# Altium footprint library ADP_Connector.PcbLib: 49 footprints (part 1 of 4)
Each footprint in its own frame and in the unit in brackets; x right, y up, seen from the top. Pads: shape width x height; smd on the part's side, far side on the other; paste and mask are expansions set on the pad; w line width, h text height; cw(c..) or ccw(c..) is an arc to the next point about the centre after c.
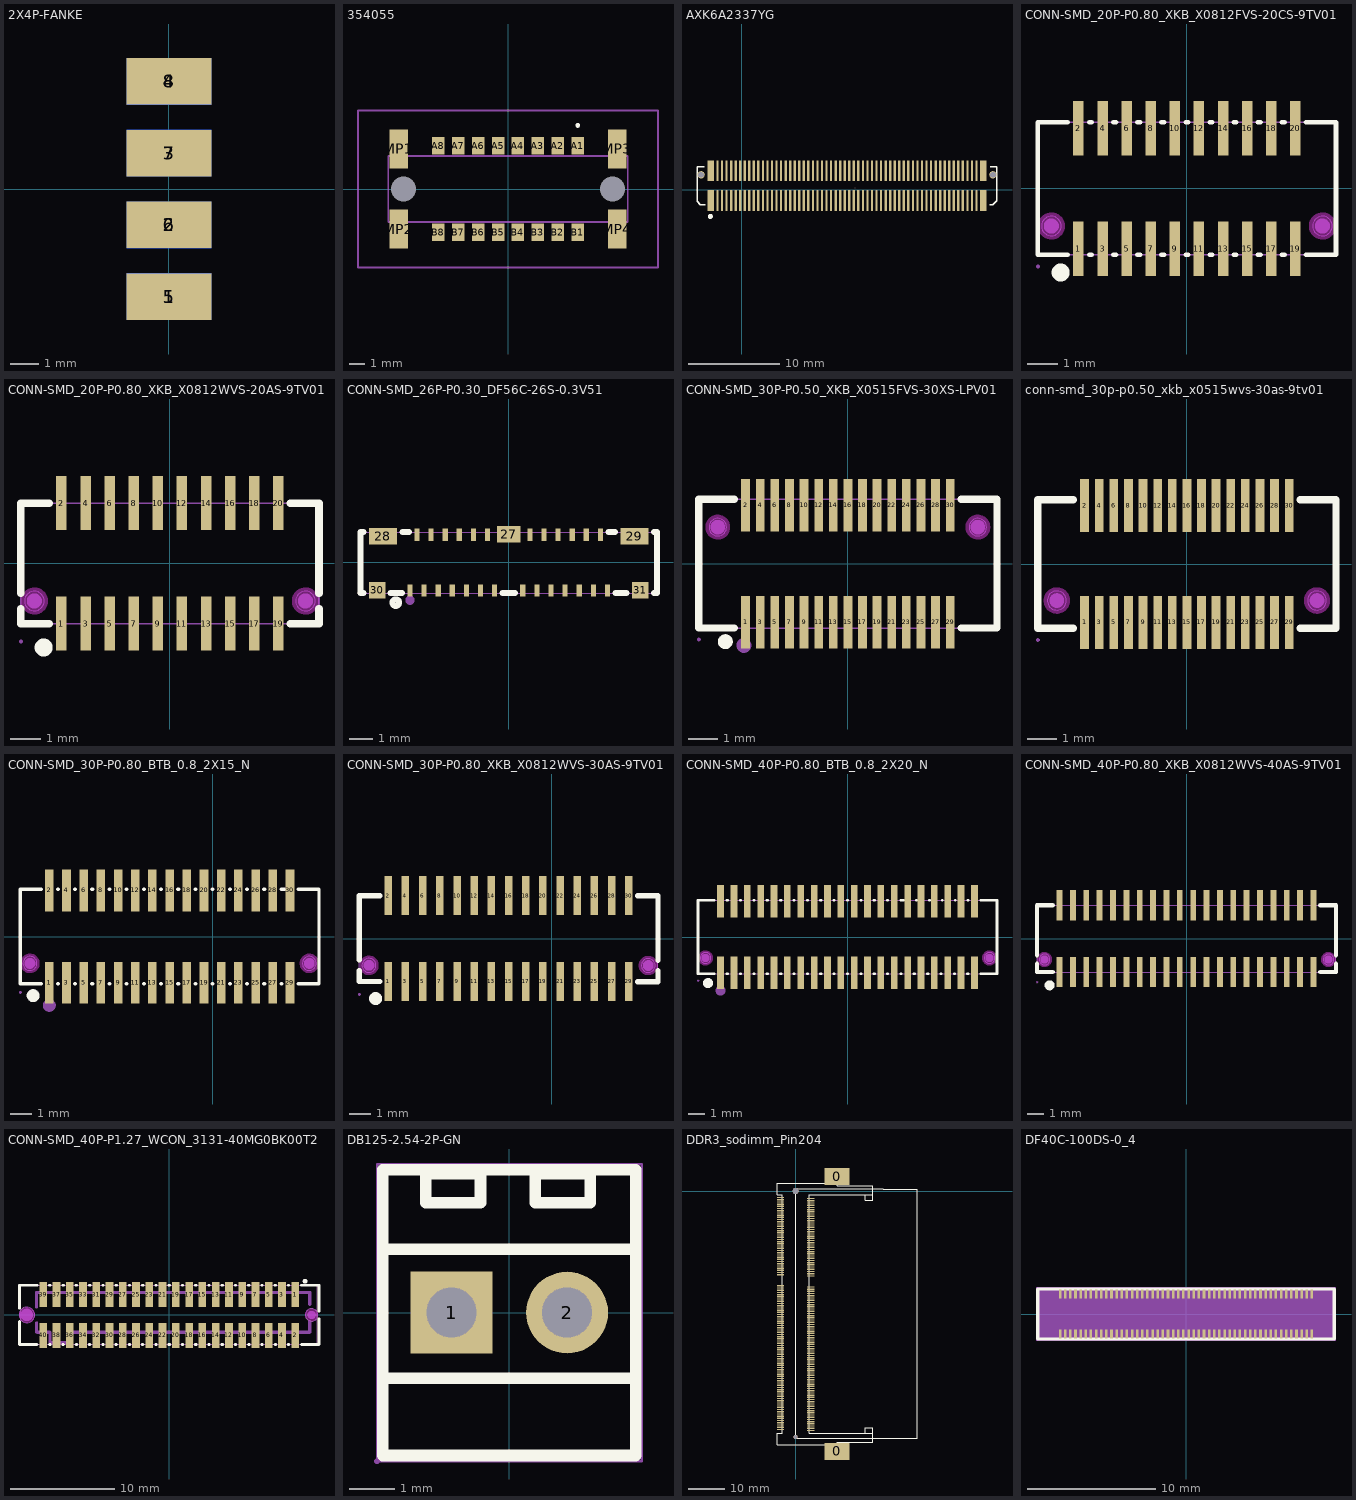
[diagram p0: the footprints below, top view; thin cyan lines are the x and y axes]

## 2X4P-FANKE [mm]
pads (8):
  rect 3x1.65 smd: 1(0,-3.81) 2(0,-1.27) 3(0,1.27) 4(0,3.81)
  rect 3x1.65 smd far side: 5(0,-3.81) 6(0,-1.27) 7(0,1.27) 8(0,3.81)
3D body "User Library-2_54mm Male Header (4x2).STEP": height 1.84, standoff -3.14, extent -1.249,-5.08 10.291,5.08

## 354055 [mm]
pads (22):
  rect 0.8x1.1 smd: A1(4.445,2.75) A2(3.175,2.75) A3(1.905,2.75) A4(0.635,2.75) A5(-0.635,2.75) A6(-1.905,2.75) A7(-3.175,2.75) A8(-4.445,2.75) B1(4.445,-2.75) B2(3.175,-2.75) B3(1.905,-2.75) B4(0.635,-2.75) B5(-0.635,-2.75) B6(-1.905,-2.75) B7(-3.175,-2.75) B8(-4.445,-2.75)
  round 0.8 hole 1.6 unplated: MH1(-6.655,0) MH2(6.655,0)
  rect 1.2x2.5 smd: MP1(-6.955,2.55) MP2(-6.955,-2.55) MP3(6.955,2.55) MP4(6.955,-2.55)
Top Overlay:
  lines w0.2: 4.445,4 ccw(c4.445,4.05) 4.445,4.1 ; 4.445,4 cw(c4.445,4.05) 4.445,4.1 ; 4.445,4 ccw(c4.445,4.05) 4.445,4.1
Mechanical 15:
  lines w0.1: -7.62,-2.1 -7.62,2.1 7.62,2.1 7.62,-2.1 -7.62,-2.1
Bottom Assembly:
  lines w0.1: -9.555,-5 -9.555,5 9.555,5 9.555,-5 -9.555,-5
3D body "354055.stp": height 5.8, standoff -4.65, extent -10,-3.376 10,3.376

## AXK6A2337YG [mm] "AXK6A2337YG-120PIN"
pads (122):
  round 0.8 hole 0.65: 1(-4.475,1.624) 2(27.625,1.624)
  rect 0.75x2.3 smd: 1(-3.425,-1.226) 2(-3.425,2.074) 119(26.575,-1.226) 120(26.575,2.074)
  rect 0.25x2.3 smd: 3(-2.675,-1.226) 4(-2.675,2.074) 5(-2.175,-1.226) 6(-2.175,2.074) 7(-1.675,-1.226) 8(-1.675,2.074) 9(-1.175,-1.226) 10(-1.175,2.074) 11(-0.675,-1.226) 12(-0.675,2.074) 13(-0.175,-1.226) 14(-0.175,2.074) 15(0.325,-1.226) 16(0.325,2.074) 17(0.825,-1.226) 18(0.825,2.074) 19(1.325,-1.226) 20(1.325,2.074) 21(1.825,-1.226) 22(1.825,2.074) 23(2.325,-1.226) 24(2.325,2.074) 25(2.825,-1.226) 26(2.825,2.074) 27(3.325,-1.226) 28(3.325,2.074) 29(3.825,-1.226) 30(3.825,2.074) 31(4.325,-1.226) 32(4.325,2.074) 33(4.825,-1.226) 34(4.825,2.074) 35(5.325,-1.226) 36(5.325,2.074) 37(5.825,-1.226) 38(5.825,2.074) 39(6.325,-1.226) 40(6.325,2.074) 41(6.825,-1.226) 42(6.825,2.074) 43(7.325,-1.226) 44(7.325,2.074) 45(7.825,-1.226) 46(7.825,2.074) 47(8.325,-1.226) 48(8.325,2.074) 49(8.825,-1.226) 50(8.825,2.074) 51(9.325,-1.226) 52(9.325,2.074) 53(9.825,-1.226) 54(9.825,2.074) 55(10.325,-1.226) 56(10.325,2.074) 57(10.825,-1.226) 58(10.825,2.074) 59(11.325,-1.226) 60(11.325,2.074) 61(11.825,-1.226) 62(11.825,2.074) 63(12.325,-1.226) 64(12.325,2.074) 65(12.825,-1.226) 66(12.825,2.074) 67(13.325,-1.226) 68(13.325,2.074) 69(13.825,-1.226) 70(13.825,2.074) 71(14.325,-1.226) 72(14.325,2.074) 73(14.825,-1.226) 74(14.825,2.074) 75(15.325,-1.226) 76(15.325,2.074) 77(15.825,-1.226) 78(15.825,2.074) 79(16.325,-1.226) 80(16.325,2.074) 81(16.825,-1.226) 82(16.825,2.074) 83(17.325,-1.226) 84(17.325,2.074) 85(17.825,-1.226) 86(17.825,2.074) 87(18.325,-1.226) 88(18.325,2.074) 89(18.825,-1.226) 90(18.825,2.074) 91(19.325,-1.226) 92(19.325,2.074) 93(19.825,-1.226) 94(19.825,2.074) 95(20.325,-1.226) 96(20.325,2.074) 97(20.825,-1.226) 98(20.825,2.074) 99(21.325,-1.226) 100(21.325,2.074) 101(21.825,-1.226) 102(21.825,2.074) 103(22.325,-1.226) 104(22.325,2.074) 105(22.825,-1.226) 106(22.825,2.074) 107(23.325,-1.226) 108(23.325,2.074) 109(23.825,-1.226) 110(23.825,2.074) 111(24.325,-1.226) 112(24.325,2.074) 113(24.825,-1.226) 114(24.825,2.074) 115(25.325,-1.226) 116(25.325,2.074) 117(25.825,-1.226) 118(25.825,2.074)
Top Overlay:
  lines w0.152: -4.122,2.524 -4.929,2.524 -4.929,-1.301 -4.554,-1.676 -4.046,-1.676 ; 27.272,-1.676 27.63,-1.676 28.079,-1.227 28.079,2.524 27.349,2.524
  lines w0.254: -3.61,-2.954 ccw(c-3.462,-2.954) -3.61,-2.947
Mechanical 1:
  text "117" at 25.825,-1.988 h0.64
  text "111" at 24.325,-1.988 h0.64
  text "115" at 25.325,-1.988 h0.64
  text "113" at 24.825,-1.988 h0.64
  text "100" at 21.325,1.312 h0.64
  text "9" at -1.203,-0.846 h0.64
  text "10" at -1.175,1.566 h0.64
  text "20" at 1.325,1.566 h0.64
  text "19" at 1.325,-1.734 h0.64
  text "30" at 3.825,1.566 h0.64
  text "29" at 3.825,-1.734 h0.64
  text "39" at 6.325,-1.734 h0.64
  text "49" at 8.825,-1.734 h0.64
  text "50" at 8.825,1.566 h0.64
  text "60" at 11.325,1.566 h0.64
  text "59" at 11.325,-1.734 h0.64
  text "70" at 13.825,1.566 h0.64
  text "69" at 13.825,-1.734 h0.64
  text "80" at 16.325,1.566 h0.64
  text "79" at 16.325,-1.734 h0.64
  text "89" at 18.825,-1.734 h0.64
  text "90" at 18.825,1.566 h0.64
  text "99" at 21.325,-1.734 h0.64
  text "110" at 23.825,1.312 h0.64
  text "109" at 23.825,-1.988 h0.64
  text "40" at 6.325,1.566 h0.64
  text "78" at 15.825,1.566 h0.64
  text "76" at 15.325,1.566 h0.64
  text "74" at 14.825,1.566 h0.64
  text "72" at 14.325,1.566 h0.64
  text "68" at 13.325,1.566 h0.64
  text "66" at 12.825,1.566 h0.64
  text "77" at 15.825,-1.734 h0.64
  text "75" at 15.325,-1.734 h0.64
  text "64" at 12.402,1.576 h0.64
  text "62" at 11.825,1.566 h0.64
  text "58" at 10.825,1.566 h0.64
  text "56" at 10.325,1.566 h0.64
  text "63" at 12.325,-1.734 h0.64
  text "61" at 12.085,-1.598 h0.64
  text "67" at 13.325,-1.734 h0.64
  text "65" at 12.825,-1.734 h0.64
  text "54" at 9.825,1.566 h0.64
  text "52" at 9.325,1.566 h0.64
  text "48" at 8.325,1.566 h0.64
  text "46" at 7.825,1.566 h0.64
  text "57" at 10.825,-1.734 h0.64
  text "55" at 10.325,-1.734 h0.64
  text "53" at 9.825,-1.734 h0.64
  text "51" at 9.325,-1.734 h0.64
  text "47" at 8.325,-1.734 h0.64
  text "45" at 7.825,-1.734 h0.64
  text "41" at 6.825,-1.734 h0.64
  text "27" at 3.325,-1.734 h0.64
  text "25" at 2.825,-1.734 h0.64
  text "23" at 2.325,-1.734 h0.64
  text "21" at 1.825,-1.734 h0.64
  text "43" at 7.325,-1.734 h0.64
  text "31" at 4.325,-1.734 h0.64
  text "33" at 4.825,-1.734 h0.64
  text "42" at 7.082,1.697 h0.64
  text "44" at 7.325,1.566 h0.64
  text "2" at -3.425,2.455 h0.64
  text "4" at -2.493,2.398 h0.64
  text "6" at -2.203,2.454 h0.64
  text "8" at -1.675,2.455 h0.64
  text "5" at -2.175,-0.845 h0.64
  text "1" at -3.425,-0.845 h0.64
  text "3" at -2.675,-0.845 h0.64
  text "7" at -1.735,-0.85 h0.64
  text "112" at 24.325,1.312 h0.64
  text "24" at 2.325,1.566 h0.64
  text "34" at 4.825,1.566 h0.64
  text "22" at 1.825,1.566 h0.64
  text "38" at 5.825,1.566 h0.64
  text "26" at 2.825,1.566 h0.64
  text "36" at 5.325,1.566 h0.64
  text "32" at 4.325,1.566 h0.64
  text "28" at 3.325,1.566 h0.64
  text "18" at 0.825,1.566 h0.64
  text "16" at 0.325,1.566 h0.64
  text "14" at -0.175,1.566 h0.64
  text "12" at -0.675,1.566 h0.64
  text "11" at -0.357,-1.416 h0.64
  text "13" at -0.175,-1.734 h0.64
  text "15" at 0.325,-1.734 h0.64
  text "17" at 0.825,-1.734 h0.64
  text "114" at 24.913,1.325 h0.64
  text "118" at 25.825,1.312 h0.64
  text "116" at 25.325,1.312 h0.64
  text "119" at 26.575,-1.988 h0.64
  text "122" at 27.625,0.862 h0.64
  text "121" at -4.475,0.862 h0.64
  text "120" at 26.575,1.312 h0.64
  text "106" at 22.825,1.312 h0.64
  text "102" at 21.825,1.312 h0.64
  text "83" at 17.325,-1.734 h0.64
  text "105" at 22.825,-1.988 h0.64
  text "81" at 16.825,-1.734 h0.64
  text "87" at 18.325,-1.734 h0.64
  text "104" at 22.325,1.312 h0.64
  text "98" at 20.825,1.566 h0.64
  text "85" at 17.825,-1.734 h0.64
  text "96" at 20.325,1.566 h0.64
  text "107" at 23.325,-1.988 h0.64
  text "93" at 19.836,-1.734 h0.64
  text "108" at 23.325,1.312 h0.64
  text "103" at 22.325,-1.988 h0.64
  text "101" at 21.825,-1.988 h0.64
  text "91" at 19.582,-1.603 h0.64
  text "37" at 5.825,-1.734 h0.64
  text "94" at 19.902,1.576 h0.64
  text "92" at 19.325,1.566 h0.64
  text "86" at 17.825,1.566 h0.64
  text "88" at 18.325,1.566 h0.64
  text "84" at 17.325,1.566 h0.64
  text "82" at 16.825,1.566 h0.64
  text "71" at 14.325,-1.734 h0.64
  text "35" at 5.325,-1.734 h0.64
  text "73" at 14.825,-1.734 h0.64
  text "97" at 20.825,-1.734 h0.64
  text "95" at 20.325,-1.734 h0.64
Mechanical 15:
  lines w0.003: 12.459,0.163 12.51,0.214

## CONN-SMD_20P-P0.80_XKB_X0812FVS-20CS-9TV01 [mm]
pads (20):
  rect 0.35x1.805 smd: 1(-3.6,-2) 2(-3.6,2) 3(-2.8,-2) 4(-2.8,2) 5(-2,-2) 6(-2,2) 7(-1.2,-2) 8(-1.2,2) 9(-0.4,-2) 10(-0.4,2) 11(0.4,-2) 12(0.4,2) 13(1.2,-2) 14(1.2,2) 15(2,-2) 16(2,2) 17(2.8,-2) 18(2.8,2) 19(3.6,-2) 20(3.6,2)
Top Overlay:
  circle w0.3: c-4.191,-2.794 r0.15
  lines w0.152: -3.955,-2.2 -4.95,-2.2 -4.95,2.2 -3.955,2.2 ; -3.245,-2.2 -3.155,-2.2 ; -3.245,2.2 -3.155,2.2 ; -2.445,-2.2 -2.355,-2.2 ; -2.445,2.2 -2.355,2.2 ; -1.645,-2.2 -1.555,-2.2 ; -1.645,2.2 -1.555,2.2 ; -0.845,-2.2 -0.755,-2.2 ; -0.845,2.2 -0.755,2.2 ; -0.045,-2.2 0.045,-2.2 ; -0.045,2.2 0.045,2.2 ; 0.755,-2.2 0.845,-2.2 ; 0.755,2.2 0.845,2.2 ; 1.555,-2.2 1.645,-2.2 ; 1.555,2.2 1.645,2.2 ; 2.355,-2.2 2.445,-2.2 ; 2.355,2.2 2.445,2.2 ; 3.155,-2.2 3.245,-2.2 ; 3.155,2.2 3.245,2.2 ; 3.955,-2.2 4.95,-2.2 4.95,2.2 3.955,2.2
Keep-Out Layer:
  board cut-out: 4.825,-1.25 4.824,-1.186 4.774,-1.068 4.683,-0.978 4.564,-0.929 4.436,-0.929 4.317,-0.978 4.226,-1.068 4.176,-1.186 4.175,-1.25 4.176,-1.314 4.226,-1.432 4.317,-1.522 4.436,-1.571 4.564,-1.571 4.683,-1.522 4.774,-1.432 4.824,-1.314 4.825,-1.25
  board cut-out: -4.175,-1.25 -4.176,-1.186 -4.226,-1.068 -4.317,-0.978 -4.436,-0.929 -4.564,-0.929 -4.683,-0.978 -4.774,-1.068 -4.824,-1.186 -4.825,-1.25 -4.824,-1.314 -4.774,-1.432 -4.683,-1.522 -4.564,-1.571 -4.436,-1.571 -4.317,-1.522 -4.226,-1.432 -4.176,-1.314 -4.175,-1.25
Mechanical 1:
  circle w0.025: c4.5,-1.25 r0.325
  circle w0.025: c-4.5,-1.25 r0.325
Mechanical 6:
  circle w0.25: c4.5,-1.25 r0.125
  circle w0.25: c-4.5,-1.25 r0.125
Mechanical 15:
  region: -3.725,-1.4 -3.475,-1.4 -3.475,-2.6 -3.725,-2.6
  region: -3.725,2.6 -3.475,2.6 -3.475,1.4 -3.725,1.4
  region: -2.925,-1.4 -2.675,-1.4 -2.675,-2.6 -2.925,-2.6
  region: -2.925,2.6 -2.675,2.6 -2.675,1.4 -2.925,1.4
  region: -2.125,-1.4 -1.875,-1.4 -1.875,-2.6 -2.125,-2.6
  region: -2.125,2.6 -1.875,2.6 -1.875,1.4 -2.125,1.4
  region: -1.325,-1.4 -1.075,-1.4 -1.075,-2.6 -1.325,-2.6
  region: -1.325,2.6 -1.075,2.6 -1.075,1.4 -1.325,1.4
  region: -0.525,-1.4 -0.275,-1.4 -0.275,-2.6 -0.525,-2.6
  region: 3.475,2.6 3.725,2.6 3.725,1.4 3.475,1.4
  region: -0.525,2.6 -0.275,2.6 -0.275,1.4 -0.525,1.4
  region: 3.475,-1.4 3.725,-1.4 3.725,-2.6 3.475,-2.6
  region: 0.275,-1.4 0.525,-1.4 0.525,-2.6 0.275,-2.6
  region: 2.675,2.6 2.925,2.6 2.925,1.4 2.675,1.4
  region: 0.275,2.6 0.525,2.6 0.525,1.4 0.275,1.4
  region: 2.675,-1.4 2.925,-1.4 2.925,-2.6 2.675,-2.6
  region: 1.075,-1.4 1.325,-1.4 1.325,-2.6 1.075,-2.6
  region: 1.875,2.6 2.125,2.6 2.125,1.4 1.875,1.4
  region: 1.075,2.6 1.325,2.6 1.325,1.4 1.075,1.4
  region: 1.875,-1.4 2.125,-1.4 2.125,-2.6 1.875,-2.6
  region: -4.89,-2.6 -4.89,-2.575 -4.925,-2.54 -4.975,-2.54 -5.01,-2.575 -5.01,-2.6 -5.01,-2.625 -4.975,-2.66 -4.925,-2.66 -4.89,-2.625 -4.89,-2.6
  lines w0.051: -4.95,-2.2 4.95,-2.2 4.95,2.2 -4.95,2.2 -4.95,-2.2
Multi-Layer keep-out:
  circle w0.254: c4.5,-1.25 r0.325
  circle w0.254: c-4.5,-1.25 r0.325

## CONN-SMD_20P-P0.80_XKB_X0812WVS-20AS-9TV01 [mm]
pads (20):
  rect 0.35x1.8 smd: 1(-3.6,-2) 2(-3.6,2) 3(-2.8,-2) 4(-2.8,2) 5(-2,-2) 6(-2,2) 7(-1.2,-2) 8(-1.2,2) 9(-0.4,-2) 10(-0.4,2) 11(0.4,-2) 12(0.4,2) 13(1.2,-2) 14(1.2,2) 15(2,-2) 16(2,2) 17(2.8,-2) 18(2.8,2) 19(3.6,-2) 20(3.6,2)
Top Overlay:
  circle w0.3: c-4.191,-2.794 r0.15
  lines w0.254: -4.95,-1.504 -4.95,-2 -4.006,-2 ; -4.95,-0.996 -4.95,2 -4.006,2 ; 4.006,-2 4.95,-2 4.95,-1.504 ; 4.006,2 4.95,2 4.95,-0.996
Keep-Out Layer:
  board cut-out: 4.825,-1.25 4.825,-1.185 4.776,-1.066 4.684,-0.974 4.565,-0.925 4.435,-0.925 4.316,-0.974 4.225,-1.066 4.175,-1.185 4.175,-1.25 4.175,-1.315 4.225,-1.434 4.316,-1.525 4.435,-1.575 4.565,-1.575 4.684,-1.525 4.776,-1.434 4.825,-1.315 4.825,-1.25
  board cut-out: -4.175,-1.25 -4.175,-1.185 -4.225,-1.066 -4.316,-0.974 -4.435,-0.925 -4.565,-0.925 -4.684,-0.974 -4.776,-1.066 -4.825,-1.185 -4.825,-1.25 -4.825,-1.315 -4.776,-1.434 -4.684,-1.525 -4.565,-1.575 -4.435,-1.575 -4.316,-1.525 -4.225,-1.434 -4.175,-1.315 -4.175,-1.25
Mechanical 1:
  circle w0.025: c4.5,-1.25 r0.325
  circle w0.025: c-4.5,-1.25 r0.325
Mechanical 6:
  circle w0.25: c4.5,-1.25 r0.125
  circle w0.25: c-4.5,-1.25 r0.125
Mechanical 15:
  region: -4.89,-2.6 -4.89,-2.575 -4.925,-2.54 -4.975,-2.54 -5.01,-2.575 -5.01,-2.6 -5.01,-2.625 -4.975,-2.66 -4.925,-2.66 -4.89,-2.625 -4.89,-2.6
  region: -3.725,-1.4 -3.475,-1.4 -3.475,-2.6 -3.725,-2.6
  region: -3.725,2.6 -3.475,2.6 -3.475,1.4 -3.725,1.4
  region: -2.925,-1.4 -2.675,-1.4 -2.675,-2.6 -2.925,-2.6
  region: -2.925,2.6 -2.675,2.6 -2.675,1.4 -2.925,1.4
  region: -2.125,-1.4 -1.875,-1.4 -1.875,-2.6 -2.125,-2.6
  region: -2.125,2.6 -1.875,2.6 -1.875,1.4 -2.125,1.4
  region: -1.325,-1.4 -1.075,-1.4 -1.075,-2.6 -1.325,-2.6
  region: -1.325,2.6 -1.075,2.6 -1.075,1.4 -1.325,1.4
  region: -0.525,-1.4 -0.275,-1.4 -0.275,-2.6 -0.525,-2.6
  region: 3.475,2.6 3.725,2.6 3.725,1.4 3.475,1.4
  region: -0.525,2.6 -0.275,2.6 -0.275,1.4 -0.525,1.4
  region: 3.475,-1.4 3.725,-1.4 3.725,-2.6 3.475,-2.6
  region: 0.275,-1.4 0.525,-1.4 0.525,-2.6 0.275,-2.6
  region: 2.675,2.6 2.925,2.6 2.925,1.4 2.675,1.4
  region: 0.275,2.6 0.525,2.6 0.525,1.4 0.275,1.4
  region: 2.675,-1.4 2.925,-1.4 2.925,-2.6 2.675,-2.6
  region: 1.075,-1.4 1.325,-1.4 1.325,-2.6 1.075,-2.6
  region: 1.875,2.6 2.125,2.6 2.125,1.4 1.875,1.4
  region: 1.075,2.6 1.325,2.6 1.325,1.4 1.075,1.4
  region: 1.875,-1.4 2.125,-1.4 2.125,-2.6 1.875,-2.6
  lines w0.051: -4.95,-2 -4.95,2 4.95,2 4.95,-2 -4.95,-2
Multi-Layer keep-out:
  circle w0.254: c4.5,-1.25 r0.325
  circle w0.254: c-4.5,-1.25 r0.325

## CONN-SMD_26P-P0.30_DF56C-26S-0.3V51 [mm]
pads (31):
  rect 0.22x0.52 smd paste+0 mask+0.05: 1(-4.2,-1.192) 2(-3.9,1.177) 3(-3.6,-1.192) 4(-3.3,1.177) 5(-3,-1.192) 6(-2.7,1.177) 7(-2.4,-1.192) 8(-2.1,1.177) 9(-1.8,-1.192) 10(-1.5,1.177) 11(-1.2,-1.192) 12(-0.9,1.177) 13(-0.6,-1.192) 14(0.9,1.177) 15(0.6,-1.192) 16(1.5,1.177) 17(1.2,-1.192) 18(2.1,1.177) 19(1.8,-1.192) 20(2.7,1.177) 21(2.4,-1.192) 22(3.3,1.177) 23(3,-1.192) 24(3.9,1.177) 25(3.6,-1.192) 26(4.2,-1.192)
  rect 1x0.7 smd paste+0 mask+0.05: 27(0,1.192)
  rect 1.2x0.7 smd paste+0 mask+0.05: 28(-5.35,1.117) 29(5.35,1.117)
  rect 0.7x0.7 smd paste+0 mask+0.05: 30(-5.6,-1.182) 31(5.6,-1.182)
Top Overlay:
  circle w0.254: c-4.8,-1.708 r0.141
  lines w0.254: -6.181,-1.307 -6.3,-1.307 -6.3,1.293 -6.181,1.293 ; -5.019,-1.307 -4.541,-1.307 ; -4.519,1.293 -4.241,1.293 ; -0.259,-1.307 0.259,-1.307 ; 4.241,1.293 4.519,1.293 ; 4.541,-1.307 5.019,-1.307 ; 6.181,-1.307 6.3,-1.307 6.3,1.293 6.181,1.293
Mechanical 6:
  circle w0.2: c-4.2,-1.607 r0.1
Mechanical 15:
  drawing of 36 lines, arcs and shapes, not listed

## CONN-SMD_30P-P0.50_XKB_X0515FVS-30XS-LPV01 [mm]
pads (30):
  rect 0.3x1.8 smd paste+0 mask+0.05: 1(-3.5,-2) 2(-3.5,2) 3(-3,-2) 4(-3,2) 5(-2.5,-2) 6(-2.5,2) 7(-2,-2) 8(-2,2) 9(-1.5,-2) 10(-1.5,2) 11(-1,-2) 12(-1,2) 13(-0.5,-2) 14(-0.5,2) 15(0,-2) 16(0,2) 17(0.5,-2) 18(0.5,2) 19(1,-2) 20(1,2) 21(1.5,-2) 22(1.5,2) 23(2,-2) 24(2,2) 25(2.5,-2) 26(2.5,2) 27(3,-2) 28(3,2) 29(3.5,-2) 30(3.5,2)
Top Overlay:
  circle w0.254: c-4.191,-2.667 r0.127
  lines w0.254: -5.1,-2.2 -3.881,-2.2 ; -5.1,-2.159 -5.1,2.2 -3.881,2.2 ; 3.881,-2.2 5.1,-2.2 5.1,2.2 3.881,2.2
Keep-Out Layer:
  board cut-out: -4.15,1.25 -4.15,1.31 -4.196,1.42 -4.28,1.504 -4.39,1.55 -4.51,1.55 -4.62,1.504 -4.704,1.42 -4.75,1.31 -4.75,1.25 -4.75,1.19 -4.704,1.08 -4.62,0.996 -4.51,0.95 -4.39,0.95 -4.28,0.996 -4.196,1.08 -4.15,1.191 -4.15,1.25
  board cut-out: 4.745,1.25 4.745,1.31 4.699,1.42 4.615,1.504 4.505,1.55 4.385,1.55 4.275,1.504 4.191,1.42 4.145,1.31 4.145,1.25 4.145,1.19 4.191,1.08 4.275,0.996 4.386,0.95 4.505,0.95 4.615,0.996 4.699,1.08 4.745,1.191 4.745,1.25
Mechanical 1:
  circle w0.025: c-4.45,1.25 r0.3
  circle w0.025: c4.445,1.25 r0.3
Mechanical 6:
  circle w0.25: c-4.45,1.25 r0.125
  circle w0.25: c4.445,1.25 r0.125
  circle w0.254: c-3.556,-2.794 r0.127
Mechanical 15:
  drawing of 35 lines, arcs and shapes, not listed
Multi-Layer keep-out:
  circle w0.254: c-4.45,1.25 r0.3
  circle w0.254: c4.445,1.25 r0.3

## conn-smd_30p-p0.50_xkb_x0515wvs-30as-9tv01 [mm]
pads (30):
  rect 0.3x1.8 smd: 1(-3.5,-2) 2(-3.5,2) 3(-3,-2) 4(-3,2) 5(-2.5,-2) 6(-2.5,2) 7(-2,-2) 8(-2,2) 9(-1.5,-2) 10(-1.5,2) 11(-1,-2) 12(-1,2) 13(-0.5,-2) 14(-0.5,2) 15(0,-2) 16(0,2) 17(0.5,-2) 18(0.5,2) 19(1,-2) 20(1,2) 21(1.5,-2) 22(1.5,2) 23(2,-2) 24(2,2) 25(2.5,-2) 26(2.5,2) 27(3,-2) 28(3,2) 29(3.5,-2) 30(3.5,2)
Top Overlay:
  lines w0.254: -3.881,-2.2 -5.1,-2.2 -5.1,2.2 -3.881,2.2 ; 3.881,-2.2 5.1,-2.2 5.1,2.2 3.881,2.2
Keep-Out Layer:
  board cut-out: -4.125,-1.25 -4.126,-1.186 -4.177,-1.069 -4.268,-0.979 -4.386,-0.931 -4.514,-0.931 -4.632,-0.979 -4.723,-1.069 -4.774,-1.186 -4.775,-1.25 -4.774,-1.314 -4.723,-1.431 -4.632,-1.521 -4.514,-1.569 -4.386,-1.569 -4.268,-1.521 -4.177,-1.431 -4.126,-1.314 -4.125,-1.25
  board cut-out: 4.775,-1.25 4.774,-1.186 4.723,-1.069 4.632,-0.979 4.514,-0.931 4.386,-0.931 4.268,-0.979 4.177,-1.069 4.126,-1.186 4.125,-1.25 4.126,-1.314 4.177,-1.431 4.268,-1.521 4.386,-1.569 4.514,-1.569 4.632,-1.521 4.723,-1.431 4.774,-1.314 4.775,-1.25
Mechanical 1:
  circle w0.025: c-4.45,-1.25 r0.325
  circle w0.025: c4.45,-1.25 r0.325
Mechanical 6:
  circle w0.25: c-4.45,-1.25 r0.125
  circle w0.25: c-4.45,-1.25 r0.125
  circle w0.25: c4.45,-1.25 r0.125
  circle w0.25: c4.45,-1.25 r0.125
Mechanical 15:
  drawing of 31 lines, arcs and shapes, not listed
Multi-Layer keep-out:
  circle w0.254: c-4.45,-1.25 r0.325
  circle w0.254: c4.45,-1.25 r0.325

## CONN-SMD_30P-P0.80_BTB_0.8_2X15_N [mm]
pads (30):
  rect 0.4x1.945 smd: 1(-7.6,-2.148) 2(-7.6,2.146) 3(-6.8,-2.148) 4(-6.8,2.146) 5(-6,-2.148) 6(-6,2.146) 7(-5.2,-2.148) 8(-5.2,2.146) 9(-4.4,-2.148) 10(-4.4,2.146) 11(-3.6,-2.148) 12(-3.6,2.146) 13(-2.8,-2.148) 14(-2.8,2.146) 15(-2,-2.148) 16(-2,2.146) 17(-1.2,-2.148) 18(-1.2,2.146) 19(-0.4,-2.148) 20(-0.4,2.146) 21(0.4,-2.148) 22(0.4,2.146) 23(1.2,-2.148) 24(1.2,2.146) 25(2,-2.148) 26(2,2.146) 27(2.8,-2.148) 28(2.8,2.146)
  rect 0.4x1.945 smd paste+0 mask+0.05: 29(3.6,-2.148) 30(3.6,2.148)
Top Overlay:
  circle w0.3: c-8.35,-2.751 r0.15
  lines w0.152: -7.98,-2.2 -8.95,-2.2 -8.95,2.2 -7.98,2.2 ; -7.22,-2.2 -7.18,-2.2 ; -7.22,2.2 -7.18,2.2 ; -6.42,-2.2 -6.38,-2.2 ; -6.42,2.2 -6.38,2.2 ; -5.62,-2.2 -5.58,-2.2 ; -5.62,2.2 -5.58,2.2 ; -4.82,-2.2 -4.78,-2.2 ; -4.82,2.2 -4.78,2.2 ; -4.02,-2.2 -3.98,-2.2 ; -4.02,2.2 -3.98,2.2 ; -3.22,-2.2 -3.18,-2.2 ; -3.22,2.2 -3.18,2.2 ; -2.42,-2.2 -2.38,-2.2 ; -2.42,2.2 -2.38,2.2 ; -1.62,-2.2 -1.58,-2.2 ; -1.62,2.2 -1.58,2.2 ; -0.82,-2.2 -0.78,-2.2 ; -0.82,2.2 -0.78,2.2 ; -0.02,-2.2 0.02,-2.2 ; -0.02,2.2 0.02,2.2 ; 0.78,-2.2 0.82,-2.2 ; 0.78,2.2 0.82,2.2 ; 1.58,-2.2 1.62,-2.2 ; 1.58,2.2 1.62,2.2 ; 2.38,-2.2 2.42,-2.2 ; 2.38,2.2 2.42,2.2 ; 3.18,-2.2 3.22,-2.2 ; 3.18,2.2 3.37,2.2 ; 3.98,2.2 4.95,2.2 4.95,-2.2 3.98,-2.2 4.02,-2.2 ; 4.13,2.2 4.14,2.2
Keep-Out Layer:
  board cut-out: 4.825,-1.25 4.824,-1.186 4.773,-1.069 4.682,-0.979 4.564,-0.931 4.436,-0.931 4.318,-0.979 4.227,-1.069 4.176,-1.186 4.175,-1.25 4.176,-1.314 4.227,-1.431 4.318,-1.521 4.436,-1.569 4.564,-1.569 4.682,-1.521 4.773,-1.431 4.824,-1.314 4.825,-1.25
  board cut-out: -8.175,-1.25 -8.176,-1.186 -8.227,-1.069 -8.318,-0.979 -8.436,-0.931 -8.564,-0.931 -8.682,-0.979 -8.773,-1.069 -8.824,-1.186 -8.825,-1.25 -8.824,-1.314 -8.773,-1.431 -8.682,-1.521 -8.564,-1.569 -8.436,-1.569 -8.318,-1.521 -8.227,-1.431 -8.176,-1.314 -8.175,-1.25
Mechanical 1:
  circle w0.025: c4.5,-1.25 r0.325
  circle w0.025: c-8.5,-1.25 r0.325
Mechanical 6:
  circle w0.3: c-7.6,-3.201 r0.15
  circle w0.25: c-8.5,-1.251 r0.125
  circle w0.25: c4.5,-1.251 r0.125
Mechanical 15:
  drawing of 33 lines, arcs and shapes, not listed
Multi-Layer keep-out:
  circle w0.254: c4.5,-1.25 r0.325
  circle w0.254: c-8.5,-1.25 r0.325

## CONN-SMD_30P-P0.80_XKB_X0812WVS-30AS-9TV01 [mm]
pads (30):
  rect 0.35x1.8 smd: 1(-7.6,-2) 2(-7.6,2) 3(-6.8,-2) 4(-6.8,2) 5(-6,-2) 6(-6,2) 7(-5.2,-2) 8(-5.2,2) 9(-4.4,-2) 10(-4.4,2) 11(-3.6,-2) 12(-3.6,2) 13(-2.8,-2) 14(-2.8,2) 15(-2,-2) 16(-2,2) 17(-1.2,-2) 18(-1.2,2) 19(-0.4,-2) 20(-0.4,2) 21(0.4,-2) 22(0.4,2) 23(1.2,-2) 24(1.2,2) 25(2,-2) 26(2,2) 27(2.8,-2) 28(2.8,2) 29(3.6,-2) 30(3.6,2)
Top Overlay:
  circle w0.3: c-8.191,-2.794 r0.15
  lines w0.254: -8.95,-1.504 -8.95,-2 -8.001,-2 ; -8.95,-0.996 -8.95,2 -8.006,2 ; 4.013,-2.007 4.957,-2.007 4.957,-1.511 ; 4.013,1.993 4.957,1.993 4.957,-1.003
Keep-Out Layer:
  board cut-out: 4.832,-1.257 4.831,-1.192 4.781,-1.074 4.69,-0.984 4.571,-0.936 4.443,-0.936 4.324,-0.984 4.233,-1.074 4.183,-1.192 4.182,-1.257 4.183,-1.321 4.233,-1.439 4.324,-1.529 4.443,-1.577 4.571,-1.577 4.69,-1.529 4.781,-1.439 4.831,-1.321 4.832,-1.257
  board cut-out: -8.175,-1.25 -8.176,-1.186 -8.226,-1.068 -8.317,-0.978 -8.436,-0.929 -8.564,-0.929 -8.683,-0.978 -8.774,-1.068 -8.824,-1.186 -8.825,-1.25 -8.824,-1.314 -8.774,-1.432 -8.683,-1.522 -8.564,-1.571 -8.436,-1.571 -8.317,-1.522 -8.226,-1.432 -8.176,-1.314 -8.175,-1.25
Mechanical 1:
  circle w0.025: c4.507,-1.257 r0.325
  circle w0.025: c-8.5,-1.25 r0.325
Mechanical 6:
  circle w0.25: c4.507,-1.257 r0.125
  circle w0.25: c-8.5,-1.25 r0.125
Mechanical 15:
  drawing of 33 lines, arcs and shapes, not listed
Multi-Layer keep-out:
  circle w0.254: c4.507,-1.257 r0.325
  circle w0.254: c-8.5,-1.25 r0.325

## CONN-SMD_40P-P0.80_BTB_0.8_2X20_N [mm]
pads (40):
  rect 0.4x1.945 smd: 1(-7.6,-2.148) 2(-7.6,2.146) 3(-6.8,-2.148) 4(-6.8,2.146) 5(-6,-2.148) 6(-6,2.146) 7(-5.2,-2.148) 8(-5.2,2.146) 9(-4.4,-2.148) 10(-4.4,2.146) 11(-3.6,-2.148) 12(-3.6,2.146) 13(-2.8,-2.148) 14(-2.8,2.146) 15(-2,-2.148) 16(-2,2.146) 17(-1.2,-2.148) 18(-1.2,2.146) 19(-0.4,-2.148) 20(-0.4,2.146) 21(0.4,-2.148) 22(0.4,2.146) 23(1.2,-2.148) 24(1.2,2.146) 25(2,-2.148) 26(2,2.146) 27(2.8,-2.148) 28(2.8,2.146)
  rect 0.4x1.945 smd paste+0 mask+0.05: 29(3.6,-2.148) 30(3.6,2.148) 31(4.4,-2.148) 32(4.4,2.148) 33(5.2,-2.148) 34(5.2,2.148) 35(6,-2.148) 36(6,2.148) 37(6.8,-2.148) 38(6.8,2.148) 39(7.6,-2.148) 40(7.6,2.148)
Top Overlay:
  circle w0.3: c-8.35,-2.751 r0.15
  lines w0.152: -7.98,-2.2 -8.95,-2.2 -8.95,2.2 -7.98,2.2 ; -7.22,-2.2 -7.18,-2.2 ; -7.22,2.2 -7.18,2.2 ; -6.42,-2.2 -6.38,-2.2 ; -6.42,2.2 -6.38,2.2 ; -5.62,-2.2 -5.58,-2.2 ; -5.62,2.2 -5.58,2.2 ; -4.82,-2.2 -4.78,-2.2 ; -4.82,2.2 -4.78,2.2 ; -4.02,-2.2 -3.98,-2.2 ; -4.02,2.2 -3.98,2.2 ; -3.22,-2.2 -3.18,-2.2 ; -3.22,2.2 -3.18,2.2 ; -2.42,-2.2 -2.38,-2.2 ; -2.42,2.2 -2.38,2.2 ; -1.62,-2.2 -1.58,-2.2 ; -1.62,2.2 -1.58,2.2 ; -0.82,-2.2 -0.78,-2.2 ; -0.82,2.2 -0.78,2.2 ; -0.02,-2.2 0.02,-2.2 ; -0.02,2.2 0.02,2.2 ; 0.78,-2.2 0.82,-2.2 ; 0.78,2.2 0.82,2.2 ; 1.58,-2.2 1.62,-2.2 ; 1.58,2.2 1.62,2.2 ; 2.38,-2.2 2.42,-2.2 ; 2.38,2.2 2.42,2.2 ; 3.18,-2.2 3.22,-2.2 ; 3.18,2.2 3.37,2.2 ; 3.98,-2.2 4.02,-2.2 ; 4.13,2.2 4.14,2.2 ; 4.78,-2.2 4.82,-2.2 ; 4.9,2.2 4.91,2.2 ; 5.58,-2.2 5.62,-2.2 ; 5.67,2.2 5.68,2.2 ; 6.38,-2.2 6.42,-2.2 ; 6.44,2.2 6.45,2.2 ; 7.18,-2.2 7.22,-2.2 ; 7.21,2.2 7.22,2.2 ; 7.98,-2.2 8.95,-2.2 8.95,2.2 7.98,2.2
Keep-Out Layer:
  board cut-out: -8.175,-1.25 -8.176,-1.186 -8.227,-1.069 -8.318,-0.979 -8.436,-0.931 -8.564,-0.931 -8.682,-0.979 -8.773,-1.069 -8.824,-1.186 -8.825,-1.25 -8.824,-1.314 -8.773,-1.431 -8.682,-1.521 -8.564,-1.569 -8.436,-1.569 -8.318,-1.521 -8.227,-1.431 -8.176,-1.314 -8.175,-1.25
  board cut-out: 8.825,-1.25 8.824,-1.186 8.774,-1.069 8.682,-0.979 8.564,-0.931 8.436,-0.931 8.318,-0.979 8.227,-1.069 8.176,-1.186 8.175,-1.25 8.176,-1.314 8.227,-1.431 8.318,-1.521 8.436,-1.569 8.564,-1.569 8.682,-1.521 8.774,-1.431 8.824,-1.314 8.825,-1.25
Mechanical 1:
  circle w0.025: c-8.5,-1.25 r0.325
  circle w0.025: c8.5,-1.25 r0.325
Mechanical 6:
  circle w0.25: c8.5,-1.251 r0.125
  circle w0.25: c-8.5,-1.251 r0.125
  circle w0.3: c-7.6,-3.201 r0.15
Mechanical 15:
  drawing of 45 lines, arcs and shapes, not listed
Multi-Layer keep-out:
  circle w0.254: c-8.5,-1.25 r0.325
  circle w0.254: c8.5,-1.25 r0.325

## CONN-SMD_40P-P0.80_XKB_X0812WVS-40AS-9TV01 [mm]
pads (40):
  rect 0.35x1.8 smd: 1(-7.6,-2) 2(-7.6,2) 3(-6.8,-2) 4(-6.8,2) 5(-6,-2) 6(-6,2) 7(-5.2,-2) 8(-5.2,2) 9(-4.4,-2) 10(-4.4,2) 11(-3.6,-2) 12(-3.6,2) 13(-2.8,-2) 14(-2.8,2) 15(-2,-2) 16(-2,2) 17(-1.2,-2) 18(-1.2,2) 19(-0.4,-2) 20(-0.4,2) 21(0.4,-2) 22(0.4,2) 23(1.2,-2) 24(1.2,2) 25(2,-2) 26(2,2) 27(2.8,-2) 28(2.8,2) 29(3.6,-2) 30(3.6,2) 31(4.4,-2) 32(4.4,2) 33(5.2,-2) 34(5.2,2) 35(6,-2) 36(6,2) 37(6.8,-2) 38(6.8,2) 39(7.6,-2) 40(7.6,2)
Top Overlay:
  circle w0.3: c-8.191,-2.794 r0.15
  lines w0.254: -8.95,-1.504 -8.95,-2 -8.006,-2 ; -8.95,-0.996 -8.95,2 -8.006,2 ; 8.006,-2 8.95,-2 8.95,-1.504 ; 8.006,2 8.95,2 8.95,-0.996
Keep-Out Layer:
  board cut-out: -8.175,-1.25 -8.176,-1.186 -8.226,-1.068 -8.317,-0.978 -8.436,-0.929 -8.564,-0.929 -8.683,-0.978 -8.774,-1.068 -8.824,-1.186 -8.825,-1.25 -8.824,-1.314 -8.774,-1.432 -8.683,-1.522 -8.564,-1.571 -8.436,-1.571 -8.317,-1.522 -8.226,-1.432 -8.176,-1.314 -8.175,-1.25
  board cut-out: 8.825,-1.25 8.824,-1.186 8.774,-1.068 8.683,-0.978 8.564,-0.929 8.436,-0.929 8.317,-0.978 8.226,-1.068 8.176,-1.186 8.175,-1.25 8.176,-1.314 8.226,-1.432 8.317,-1.522 8.436,-1.571 8.564,-1.571 8.683,-1.522 8.774,-1.432 8.824,-1.314 8.825,-1.25
Mechanical 1:
  circle w0.025: c-8.5,-1.25 r0.325
  circle w0.025: c8.5,-1.25 r0.325
Mechanical 6:
  circle w0.25: c8.5,-1.25 r0.125
  circle w0.25: c-8.5,-1.25 r0.125
Mechanical 15:
  drawing of 45 lines, arcs and shapes, not listed
Multi-Layer keep-out:
  circle w0.254: c-8.5,-1.25 r0.325
  circle w0.254: c8.5,-1.25 r0.325

## CONN-SMD_40P-P1.27_WCON_3131-40MG0BK00T2 [mm]
pads (40):
  rect 0.74x2.4 smd: 1(12.065,1.95) 2(12.065,-1.95) 3(10.795,1.95) 4(10.795,-1.95) 5(9.525,1.95) 6(9.525,-1.95) 7(8.255,1.95) 8(8.255,-1.95) 9(6.985,1.95) 10(6.985,-1.95) 11(5.715,1.95) 12(5.715,-1.95) 13(4.445,1.95) 14(4.445,-1.95) 15(3.175,1.95) 16(3.175,-1.95) 17(1.905,1.95) 18(1.905,-1.95) 19(0.635,1.95) 20(0.635,-1.95) 21(-0.635,1.95) 22(-0.635,-1.95) 23(-1.905,1.95) 24(-1.905,-1.95) 25(-3.175,1.95) 26(-3.175,-1.95) 27(-4.445,1.95) 28(-4.445,-1.95) 29(-5.715,1.95) 30(-5.715,-1.95) 31(-6.985,1.95) 32(-6.985,-1.95) 33(-8.255,1.95) 34(-8.255,-1.95) 35(-9.525,1.95) 36(-9.525,-1.95) 37(-10.795,1.95) 38(-10.795,-1.95) 39(-12.065,1.95) 40(-12.065,-1.95)
Top Overlay:
  circle w0.254: c13.015,3.23 r0.1
  lines w0.254: -14.345,-0.625 -14.345,-2.83 -12.666,-2.83 ; -14.345,0.625 -14.345,2.83 -12.666,2.83 ; -11.464,-2.83 -11.396,-2.83 ; -11.464,2.83 -11.396,2.83 ; -10.194,-2.83 -10.126,-2.83 ; -10.194,2.83 -10.126,2.83 ; -8.924,-2.83 -8.856,-2.83 ; -8.924,2.83 -8.856,2.83 ; -7.654,-2.83 -7.586,-2.83 ; -7.654,2.83 -7.586,2.83 ; -6.384,-2.83 -6.316,-2.83 ; -6.384,2.83 -6.316,2.83 ; -5.114,-2.83 -5.046,-2.83 ; -5.114,2.83 -5.046,2.83 ; -3.844,-2.83 -3.776,-2.83 ; -3.844,2.83 -3.776,2.83 ; -2.574,-2.83 -2.506,-2.83 ; -2.574,2.83 -2.506,2.83 ; -1.304,-2.83 -1.236,-2.83 ; -1.304,2.83 -1.236,2.83 ; -0.034,-2.83 0.034,-2.83 ; -0.034,2.83 0.034,2.83 ; 1.236,-2.83 1.304,-2.83 ; 1.236,2.83 1.304,2.83 ; 2.506,-2.83 2.574,-2.83 ; 2.506,2.83 2.574,2.83 ; 3.776,-2.83 3.844,-2.83 ; 3.776,2.83 3.844,2.83 ; 5.046,-2.83 5.114,-2.83 ; 5.046,2.83 5.114,2.83 ; 6.316,-2.83 6.384,-2.83 ; 6.316,2.83 6.384,2.83 ; 7.586,-2.83 7.654,-2.83 ; 7.586,2.83 7.654,2.83 ; 8.856,-2.83 8.924,-2.83 ; 8.856,2.83 8.924,2.83 ; 10.126,-2.83 10.194,-2.83 ; 10.126,2.83 10.194,2.83 ; 11.396,-2.83 11.464,-2.83 ; 11.396,2.83 11.464,2.83 ; 12.666,-2.83 14.345,-2.83 14.345,-0.36 ; 12.666,2.83 14.345,2.83 14.345,0.36
Keep-Out Layer:
  board cut-out: -12.89,0 -12.89,0.099 -12.941,0.289 -13.04,0.461 -13.18,0.6 -13.351,0.699 -13.541,0.75 -13.739,0.75 -13.93,0.699 -14.101,0.6 -14.24,0.46 -14.339,0.289 -14.39,0.099 -14.39,0 -14.39,-0.099 -14.339,-0.29 -14.24,-0.461 -14.101,-0.6 -13.93,-0.699 -13.739,-0.75 -13.541,-0.75 -13.351,-0.699 -13.179,-0.6 -13.04,-0.461 -12.941,-0.289 -12.89,-0.099 -12.89,0
  board cut-out: 14.24,0 14.239,0.118 14.146,0.336 13.977,0.502 13.758,0.592 13.522,0.592 13.303,0.502 13.134,0.336 13.042,0.118 13.04,0 13.042,-0.118 13.134,-0.336 13.303,-0.502 13.522,-0.592 13.758,-0.592 13.977,-0.502 14.146,-0.336 14.239,-0.118 14.24,0
Mechanical 1:
  circle w0.005: c-13.64,0 r0.75
  circle w0.005: c13.64,0 r0.6
Mechanical 6:
  drawing of 4 lines, arcs and shapes, not listed
Mechanical 15:
  drawing of 45 lines, arcs and shapes, not listed

## DB125-2.54-2P-GN [mm] "KF127-2.54"
pads (2):
  rect 1.8x1.8 hole 1.1: 1(-1.27,0)
  round 1.8 hole 1.1: 2(1.27,0)
Top Overlay:
  lines w0.254: -2.78,-1.443 2.78,-1.443 ; -2.78,1.395 2.78,1.395 ; -2.78,-3.14 2.78,-3.14 2.78,3.139 -2.78,3.139 -2.78,-3.14 ; -1.841,2.413 -1.841,3.048 -0.635,3.048 -0.635,2.413 -1.841,2.413 ; 0.572,2.413 0.572,3.048 1.778,3.048 1.778,2.413 0.572,2.413
Mechanical 6:
  region: -1.94,2.985 -1.94,2.365 -1.89,2.315 -0.65,2.315 -0.64,2.325 -0.635,2.325 -0.53,2.43 -0.535,2.98 -0.745,2.98 -0.745,2.505 -1.74,2.5 -1.74,2.98
  region: 0.48,3 0.48,2.38 0.53,2.33 1.77,2.33 1.78,2.34 1.785,2.34 1.89,2.445 1.885,2.995 1.675,2.995 1.675,2.52 0.68,2.515 0.68,2.995
Mechanical 15:
  region: -1.52,0.25 -1.02,0.25 -1.02,-0.25 -1.52,-0.25
  region: 1.02,0.25 1.52,0.25 1.52,-0.25 1.02,-0.25
  region: -2.847,-3.267 -2.847,-3.242 -2.882,-3.207 -2.932,-3.207 -2.967,-3.242 -2.967,-3.267 -2.967,-3.292 -2.932,-3.327 -2.882,-3.327 -2.847,-3.292 -2.847,-3.267
  lines w0.051: -2.907,-3.267 -2.907,3.266 2.907,3.266 2.907,-3.267 -2.907,-3.267

## DDR3_sodimm_Pin204 [mm]
pads (208):
  round 1.1 hole 1.1 unplated: 0(0,-66.8)
  round 1.6 hole 1.6 unplated: 0(0,0)
  rect 6.8x4.7 smd: 0(11.3,-70.75) 0(11.3,3.95)
  rect 2x0.35 smd: 1(-4.1,-1.75) 2(4.1,-2.05) 3(-4.1,-2.35) 4(4.1,-2.65) 5(-4.1,-2.95) 6(4.1,-3.25) 7(-4.1,-3.55) 8(4.1,-3.85) 9(-4.1,-4.15) 10(4.1,-4.45) 11(-4.1,-4.75) 12(4.1,-5.05) 13(-4.1,-5.35) 14(4.1,-5.65) 15(-4.1,-5.95) 16(4.1,-6.25) 17(-4.1,-6.55) 18(4.1,-6.85) 19(-4.1,-7.15) 20(4.1,-7.45) 21(-4.1,-7.75) 22(4.1,-8.05) 23(-4.1,-8.35) 24(4.1,-8.65) 25(-4.1,-8.95) 26(4.1,-9.25) 27(-4.1,-9.55) 28(4.1,-9.85) 29(-4.1,-10.15) 30(4.1,-10.45) 31(-4.1,-10.75) 32(4.1,-11.05) 33(-4.1,-11.35) 34(4.1,-11.65) 35(-4.1,-11.95) 36(4.1,-12.25) 37(-4.1,-12.55) 38(4.1,-12.85) 39(-4.1,-13.15) 40(4.1,-13.45) 41(-4.1,-13.75) 42(4.1,-14.05) 43(-4.1,-14.35) 44(4.1,-14.65) 45(-4.1,-14.95) 46(4.1,-15.25) 47(-4.1,-15.55) 48(4.1,-15.85) 49(-4.1,-16.15) 50(4.1,-16.45) 51(-4.1,-16.75) 52(4.1,-17.05) 53(-4.1,-17.35) 54(4.1,-17.65) 55(-4.1,-17.95) 56(4.1,-18.25) 57(-4.1,-18.55) 58(4.1,-18.85) 59(-4.1,-19.15) 60(4.1,-19.45) 61(-4.1,-19.75) 62(4.1,-20.05) 63(-4.1,-20.35) 64(4.1,-20.65) 65(-4.1,-20.95) 66(4.1,-21.25) 67(-4.1,-21.55) 68(4.1,-21.85) 69(-4.1,-22.15) 70(4.1,-22.45) 71(-4.1,-22.75) 72(4.1,-23.05) 73(-4.1,-25.75) 74(4.1,-26.05) 75(-4.1,-26.35) 76(4.1,-26.65) 77(-4.1,-26.95) 78(4.1,-27.25) 79(-4.1,-27.55) 80(4.1,-27.85) 81(-4.1,-28.15) 82(4.1,-28.45) 83(-4.1,-28.75) 84(4.1,-29.05) 85(-4.1,-29.35) 86(4.1,-29.65) 87(-4.1,-29.95) 88(4.1,-30.25) 89(-4.1,-30.55) 90(4.1,-30.85) 91(-4.1,-31.15) 92(4.1,-31.45) 93(-4.1,-31.75) 94(4.1,-32.05) 95(-4.1,-32.35) 96(4.1,-32.65) 97(-4.1,-32.95) 98(4.1,-33.25) 99(-4.1,-33.55) 100(4.1,-33.85) 101(-4.1,-34.15) 102(4.1,-34.45) 103(-4.1,-34.75) 104(4.1,-35.05) 105(-4.1,-35.35) 106(4.1,-35.65) 107(-4.1,-35.95) 108(4.1,-36.25) 109(-4.1,-36.55) 110(4.1,-36.85) 111(-4.1,-37.15) 112(4.1,-37.45) 113(-4.1,-37.75) 114(4.1,-38.05) 115(-4.1,-38.35) 116(4.1,-38.65) 117(-4.1,-38.95) 118(4.1,-39.25) 119(-4.1,-39.55) 120(4.1,-39.85) 121(-4.1,-40.15) 122(4.1,-40.45) 123(-4.1,-40.75) 124(4.1,-41.05) 125(-4.1,-41.35) 126(4.1,-41.65) 127(-4.1,-41.95) 128(4.1,-42.25) 129(-4.1,-42.55) 130(4.1,-42.85) 131(-4.1,-43.15) 132(4.1,-43.45) 133(-4.1,-43.75) 134(4.1,-44.05) 135(-4.1,-44.35) 136(4.1,-44.65) 137(-4.1,-44.95) 138(4.1,-45.25) 139(-4.1,-45.55) 140(4.1,-45.85) 141(-4.1,-46.15) 142(4.1,-46.45) 143(-4.1,-46.75) 144(4.1,-47.05) 145(-4.1,-47.35) 146(4.1,-47.65) 147(-4.1,-47.95) 148(4.1,-48.25) 149(-4.1,-48.55) 150(4.1,-48.85) 151(-4.1,-49.15) 152(4.1,-49.45) 153(-4.1,-49.75) 154(4.1,-50.05) 155(-4.1,-50.35) 156(4.1,-50.65) 157(-4.1,-50.95) 158(4.1,-51.25) 159(-4.1,-51.55) 160(4.1,-51.85) 161(-4.1,-52.15) 162(4.1,-52.45) 163(-4.1,-52.75) 164(4.1,-53.05) 165(-4.1,-53.35) 166(4.1,-53.65) 167(-4.1,-53.95) 168(4.1,-54.25) 169(-4.1,-54.55) 170(4.1,-54.85) 171(-4.1,-55.15) 172(4.1,-55.45) 173(-4.1,-55.75) 174(4.1,-56.05) 175(-4.1,-56.35) 176(4.1,-56.65) 177(-4.1,-56.95) 178(4.1,-57.25) 179(-4.1,-57.55) 180(4.1,-57.85) 181(-4.1,-58.15) 182(4.1,-58.45) 183(-4.1,-58.75) 184(4.1,-59.05) 185(-4.1,-59.35) 186(4.1,-59.65) 187(-4.1,-59.95) 188(4.1,-60.25) 189(-4.1,-60.55) 190(4.1,-60.85) 191(-4.1,-61.15) 192(4.1,-61.45) 193(-4.1,-61.75) 194(4.1,-62.05) 195(-4.1,-62.35) 196(4.1,-62.65) 197(-4.1,-62.95) 198(4.1,-63.25) 199(-4.1,-63.55) 200(4.1,-63.85) 201(-4.1,-64.15) 202(4.1,-64.45) 203(-4.1,-64.75) 204(4.1,-65.05)
Top Overlay:
  lines w0.15: 20.9,-65.75 18.9,-65.75 18.9,-64.35 20.9,-64.35 20.9,-65.75 ; 20.9,-65.75 20.9,-68.25 11.3,-68.25 11.3,-68.95 -5,-68.95 -5,-65.75 -3.7,-65.75 -3.7,-1.05 -5,-1.05 -5,2.15 11.3,2.15 11.3,1.45 20.9,1.45 20.9,-1.05 ; 20.9,-65.75 3.7,-65.75 3.7,-1.05 20.9,-1.05 ; 20.9,-1.05 20.9,-2.45 18.9,-2.45 18.9,-1.05 20.9,-1.05
  lines w0.152: 23.825,0.566 0,0.566 0,-67.1 33.013,-67.1 33.013,0.553 23.838,0.553

## DF40C-100DS-0_4 [mm] "DF40C-100DS-0_4"
pads (100):
  rect 0.2x0.7 smd: A1(-9.8,1.54) A2(-9.4,1.54) A3(-9,1.54) A4(-8.6,1.54) A5(-8.2,1.54) A6(-7.8,1.54) A7(-7.4,1.54) A8(-7,1.54) A9(-6.6,1.54) A10(-6.2,1.54) A11(-5.8,1.54) A12(-5.4,1.54) A13(-5,1.54) A14(-4.6,1.54) A15(-4.2,1.54) A16(-3.8,1.54) A17(-3.4,1.54) A18(-3,1.54) A19(-2.6,1.54) A20(-2.2,1.54) A21(-1.8,1.54) A22(-1.4,1.54) A23(-1,1.54) A24(-0.6,1.54) A25(-0.2,1.54) A26(0.2,1.54) A27(0.6,1.54) A28(1,1.54) A29(1.4,1.54) A30(1.8,1.54) A31(2.2,1.54) A32(2.6,1.54) A33(3,1.54) A34(3.4,1.54) A35(3.8,1.54) A36(4.2,1.54) A37(4.6,1.54) A38(5,1.54) A39(5.4,1.54) A40(5.8,1.54) A41(6.2,1.54) A42(6.6,1.54) A43(7,1.54) A44(7.4,1.54) A45(7.8,1.54) A46(8.2,1.54) A47(8.6,1.54) A48(9,1.54) A49(9.4,1.54) A50(9.8,1.54) B1(-9.8,-1.54) B2(-9.4,-1.54) B3(-9,-1.54) B4(-8.6,-1.54) B5(-8.2,-1.54) B6(-7.8,-1.54) B7(-7.4,-1.54) B8(-7,-1.54) B9(-6.6,-1.54) B10(-6.2,-1.54) B11(-5.8,-1.54) B12(-5.4,-1.54) B13(-5,-1.54) B14(-4.6,-1.54) B15(-4.2,-1.54) B16(-3.8,-1.54) B17(-3.4,-1.54) B18(-3,-1.54) B19(-2.6,-1.54) B20(-2.2,-1.54) B21(-1.8,-1.54) B22(-1.4,-1.54) B23(-1,-1.54) B24(-0.6,-1.54) B25(-0.2,-1.54) B26(0.2,-1.54) B27(0.6,-1.54) B28(1,-1.54) B29(1.4,-1.54) B30(1.8,-1.54) B31(2.2,-1.54) B32(2.6,-1.54) B33(3,-1.54) B34(3.4,-1.54) B35(3.8,-1.54) B36(4.2,-1.54) B37(4.6,-1.54) B38(5,-1.54) B39(5.4,-1.54) B40(5.8,-1.54) B41(6.2,-1.54) B42(6.6,-1.54) B43(7,-1.54) B44(7.4,-1.54) B45(7.8,-1.54) B46(8.2,-1.54) B47(8.6,-1.54) B48(9,-1.54) B49(9.4,-1.54) B50(9.8,-1.54)
Top Overlay:
  lines w0.254: -11.55,-1.94 11.55,-1.94 11.55,1.94 -11.55,1.94 -11.55,-1.94
Top 3D Body:
  region: -11.677,-2.067 11.677,-2.067 11.677,2.067 -11.677,2.067
Top Assembly:
  text ".Designator" at -0.395,-0.1 h0.3
Mechanical 25:
  text "A34" at 3.4,2.454 h0.76
  text "A33" at 3,2.454 h0.76
  text "A36" at 4.2,2.454 h0.76
  text "A40" at 5.8,2.454 h0.76
  text "A46" at 8.2,2.454 h0.76
  text "B41" at 6.2,-0.626 h0.76
  text "A47" at 8.6,2.454 h0.76
  text "A35" at 3.8,2.454 h0.76
  text "B45" at 7.8,-0.626 h0.76
  text "A44" at 7.4,2.454 h0.76
  text "A38" at 5,2.454 h0.76
  text "A13" at -5,2.454 h0.76
  text "A37" at 4.6,2.454 h0.76
  text "B10" at -6.2,-0.626 h0.76
  text "A32" at 2.6,2.454 h0.76
  text "A43" at 7,2.454 h0.76
  text "A41" at 6.2,2.454 h0.76
  text "B13" at -5,-0.626 h0.76
  text "B44" at 7.4,-0.626 h0.76
  text "B11" at -5.8,-0.626 h0.76
  text "B42" at 6.6,-0.626 h0.76
  text "B15" at -4.2,-0.626 h0.76
  text "A17" at -3.4,2.454 h0.76
  text "B16" at -3.8,-0.626 h0.76
  text "B23" at -1,-0.626 h0.76
  text "A20" at -2.2,2.454 h0.76
  text "B19" at -2.6,-0.626 h0.76
  text "A15" at -4.2,2.454 h0.76
  text "A18" at -3,2.454 h0.76
  text "B24" at -0.6,-0.626 h0.76
  text "A21" at -1.8,2.454 h0.76
  text "A16" at -3.8,2.454 h0.76
  text "B18" at -3,-0.626 h0.76
  text "A14" at -4.6,2.454 h0.76
  text "B20" at -2.2,-0.626 h0.76
  text "B21" at -1.8,-0.626 h0.76
  text "B22" at -1.4,-0.626 h0.76
  text "B17" at -3.4,-0.626 h0.76
  text "A26" at 0.2,2.454 h0.76
  text "A25" at -0.2,2.454 h0.76
  text "A24" at -0.6,2.454 h0.76
  text "A23" at -1,2.454 h0.76
  text "A22" at -1.4,2.454 h0.76
  text "B28" at 1,-0.626 h0.76
  text "B29" at 1.4,-0.626 h0.76
  text "B26" at 0.2,-0.626 h0.76
  text "B30" at 1.8,-0.626 h0.76
  text "B27" at 0.6,-0.626 h0.76
  text "B25" at -0.2,-0.626 h0.76
  text "A19" at -2.6,2.454 h0.76
  text "A27" at 0.6,2.454 h0.76
  text "A28" at 1,2.454 h0.76
  text "A30" at 1.8,2.454 h0.76
  text "B32" at 2.6,-0.626 h0.76
  text "B33" at 3,-0.626 h0.76
  text "B34" at 3.4,-0.626 h0.76
  text "B37" at 4.6,-0.626 h0.76
  text "B38" at 5,-0.626 h0.76
  text "B35" at 3.8,-0.626 h0.76
  text "B36" at 4.2,-0.626 h0.76
  text "A29" at 1.4,2.454 h0.76
  text "B12" at -5.4,-0.626 h0.76
  text "A31" at 2.2,2.454 h0.76
  text "B39" at 5.4,-0.626 h0.76
  text "B4" at -8.6,-0.93 h0.76
  text "B5" at -8.2,-0.93 h0.76
  text "A4" at -8.6,2.15 h0.76
  text "A5" at -8.2,2.15 h0.76
  text "B8" at -7,-0.93 h0.76
  text "A1" at -9.8,2.15 h0.76
  text "B7" at -7.4,-0.93 h0.76
  text "A2" at -9.4,2.15 h0.76
  text "B1" at -9.8,-0.93 h0.76
  text "B2" at -9.4,-0.93 h0.76
  text "A11" at -5.8,2.454 h0.76
  text "A8" at -7,2.15 h0.76
  text "A10" at -6.2,2.454 h0.76
  text "A7" at -7.4,2.15 h0.76
  text "B48" at 9,-0.626 h0.76
  text "B47" at 8.6,-0.626 h0.76
  text "B49" at 9.4,-0.626 h0.76
  text "B50" at 9.8,-0.626 h0.76
  text "A49" at 9.4,2.454 h0.76
  text "A50" at 9.8,2.454 h0.76
  text "A6" at -7.8,2.15 h0.76
  text "B31" at 2.2,-0.626 h0.76
  text "B9" at -6.6,-0.93 h0.76
  text "B3" at -9,-0.93 h0.76
  text "A3" at -9,2.15 h0.76
  text "B6" at -7.8,-0.93 h0.76
  text "B14" at -4.6,-0.626 h0.76
  text "A9" at -6.6,2.15 h0.76
  text "A12" at -5.4,2.454 h0.76
  text "A48" at 9,2.454 h0.76
  text "B46" at 8.2,-0.626 h0.76
  text "B43" at 7,-0.626 h0.76
  text "A45" at 7.8,2.454 h0.76
  text "A42" at 6.6,2.454 h0.76
  text "A39" at 5.4,2.454 h0.76
  text "B40" at 5.8,-0.626 h0.76
Mechanical 36:
  text "Recommended Metal Mask Thickness: t=0.12[mm]" at -2.54,5.08 h0.3
3D body: height 3.81, standoff 0, extent -11.677,-2.067 11.677,2.067